# Altium schematic symbol library jlcpcb_2025_04_capacitors_extended_0805.schlib: 3281 symbols (part 13 of 18) (continued)
## FN21N391J500PXG
designator C?  Capacitance: 390pF  (hidden comment: *)
Capacitor, Ceramic (MLCC), 390pF, 50V, C0G, SMD 0805; Manufacturer: PSA(Prosperity Dielectrics); Manufacturer Part Number: FN21N391J500PXG; Package Size: 0805; JLCPCB Basic Part: No; JLCPCB Part Number: C2929169; Supplier 1: LCSC; Category: Capacitors - MLCC; Supplier Part Number 1: C2929169; Voltage Rating: 50V; Temperature Coefficient: C0G; RoHS: Yes; ComponentLink1Description: Datasheet; ComponentLink1URL: https://wmsc.lcsc.com/wmsc/upload/file/pdf/v2/lcsc/2201121400_PSA-Prosperity-Dielectrics-FN21N391J500PXG_C2929169.pdf; ComponentLink2Description: JLCPCB Part URL; ComponentLink2URL: https://jlcpcb.com/partdetail/C2929169; ComponentLink3Description: LCSC Part URL; ComponentLink3URL: https://lcsc.com/product-detail/Multilayer-Ceramic-Capacitors-MLCC---SMD-SMT_PSAProsperity-Dielectrics-PSAProsperity-Dielectrics-FN21N391J500PXG_C2929169.html
footprint CAP-0805 (0805 (2012M) Capacitor)
pins: 1, 2

## FN21N392J500ECG
designator C?  Capacitance: 3.9nF  (hidden comment: *)
Capacitor, Ceramic (MLCC), 3.9nF, ±5%, 50V, C0G, ±5%, SMD 0805; Manufacturer: PSA(Prosperity Dielectrics); Manufacturer Part Number: FN21N392J500ECG; Package Size: 0805; JLCPCB Basic Part: No; JLCPCB Part Number: C2915675; Supplier 1: LCSC; Category: Capacitors - MLCC; Supplier Part Number 1: C2915675; Tolerance: ±5%; Voltage Rating: 50V; Temperature Coefficient: C0G; RoHS: Yes; ComponentLink1Description: Datasheet; ComponentLink1URL: https://wmsc.lcsc.com/wmsc/upload/file/pdf/v2/lcsc/2111172030_PSA-Prosperity-Dielectrics-FN21N392J500ECG_C2915675.pdf; ComponentLink2Description: JLCPCB Part URL; ComponentLink2URL: https://jlcpcb.com/partdetail/C2915675; ComponentLink3Description: LCSC Part URL; ComponentLink3URL: https://lcsc.com/product-detail/Multilayer-Ceramic-Capacitors-MLCC---SMD-SMT_PSAProsperity-Dielectrics-PSAProsperity-Dielectrics-FN21N392J500ECG_C2915675.html
footprint CAP-0805 (0805 (2012M) Capacitor)
pins: 1, 2

## FN21N470J500PAG
designator C?  Capacitance: 47pF  (hidden comment: *)
Capacitor, Ceramic (MLCC), 47pF, ±5%, 50V, C0G, ±5%, SMD 0805; Manufacturer: PSA(Prosperity Dielectrics); Manufacturer Part Number: FN21N470J500PAG; Package Size: 0805; JLCPCB Basic Part: No; JLCPCB Part Number: C525291; Supplier 1: LCSC; Category: Capacitors - MLCC; Supplier Part Number 1: C525291; Tolerance: ±5%; Voltage Rating: 50V; Temperature Coefficient: C0G; RoHS: Yes; ComponentLink1Description: Datasheet; ComponentLink1URL: https://wmsc.lcsc.com/wmsc/upload/file/pdf/v2/lcsc/2304140030_PSA-Prosperity-Dielectrics-FN21N470J500PAG_C525291.pdf; ComponentLink2Description: JLCPCB Part URL; ComponentLink2URL: https://jlcpcb.com/partdetail/C525291; ComponentLink3Description: LCSC Part URL; ComponentLink3URL: https://lcsc.com/product-detail/Multilayer-Ceramic-Capacitors-MLCC---SMD-SMT_PSAProsperity-Dielectrics-PSAProsperity-Dielectrics-FN21N470J500PAG_C525291.html
footprint CAP-0805 (0805 (2012M) Capacitor)
pins: 1, 2

## FN21N472J500ECG
designator C?  Capacitance: 4.7nF  (hidden comment: *)
Capacitor, Ceramic (MLCC), 4.7nF, ±5%, 50V, NP0, ±5%, SMD 0805; Manufacturer: PSA(Prosperity Dielectrics); Manufacturer Part Number: FN21N472J500ECG; Package Size: 0805; JLCPCB Basic Part: No; JLCPCB Part Number: C784096; Supplier 1: LCSC; Category: Capacitors - MLCC; Supplier Part Number 1: C784096; Tolerance: ±5%; Voltage Rating: 50V; Temperature Coefficient: NP0; RoHS: Yes; ComponentLink1Description: Datasheet; ComponentLink1URL: https://wmsc.lcsc.com/wmsc/upload/file/pdf/v2/lcsc/2304140030_PSA-Prosperity-Dielectrics-FN21N472J500ECG_C784096.pdf; ComponentLink2Description: JLCPCB Part URL; ComponentLink2URL: https://jlcpcb.com/partdetail/C784096; ComponentLink3Description: LCSC Part URL; ComponentLink3URL: https://lcsc.com/product-detail/Multilayer-Ceramic-Capacitors-MLCC---SMD-SMT_PSAProsperity-Dielectrics-PSAProsperity-Dielectrics-FN21N472J500ECG_C784096.html
footprint CAP-0805 (0805 (2012M) Capacitor)
pins: 1, 2

## FN21N560J500PAG
designator C?  Capacitance: 56pF  (hidden comment: *)
Capacitor, Ceramic (MLCC), 56pF, ±5%, 50V, C0G, ±5%, SMD 0805; Manufacturer: PSA(Prosperity Dielectrics); Manufacturer Part Number: FN21N560J500PAG; Package Size: 0805; JLCPCB Basic Part: No; JLCPCB Part Number: C525293; Supplier 1: LCSC; Category: Capacitors - MLCC; Supplier Part Number 1: C525293; Tolerance: ±5%; Voltage Rating: 50V; Temperature Coefficient: C0G; RoHS: Yes; ComponentLink1Description: Datasheet; ComponentLink1URL: https://wmsc.lcsc.com/wmsc/upload/file/pdf/v2/lcsc/2304140030_PSA-Prosperity-Dielectrics-FN21N560J500PAG_C525293.pdf; ComponentLink2Description: JLCPCB Part URL; ComponentLink2URL: https://jlcpcb.com/partdetail/C525293; ComponentLink3Description: LCSC Part URL; ComponentLink3URL: https://lcsc.com/product-detail/Multilayer-Ceramic-Capacitors-MLCC---SMD-SMT_PSAProsperity-Dielectrics-PSAProsperity-Dielectrics-FN21N560J500PAG_C525293.html
footprint CAP-0805 (0805 (2012M) Capacitor)
pins: 1, 2

## FN21N561J500PXG
designator C?  Capacitance: 560pF  (hidden comment: *)
Capacitor, Ceramic (MLCC), 560pF, ±5%, 50V, C0G, ±5%, SMD 0805; Manufacturer: PSA(Prosperity Dielectrics); Manufacturer Part Number: FN21N561J500PXG; Package Size: 0805; JLCPCB Basic Part: No; JLCPCB Part Number: C525294; Supplier 1: LCSC; Category: Capacitors - MLCC; Supplier Part Number 1: C525294; Tolerance: ±5%; Voltage Rating: 50V; Temperature Coefficient: C0G; RoHS: Yes; ComponentLink1Description: Datasheet; ComponentLink1URL: https://wmsc.lcsc.com/wmsc/upload/file/pdf/v2/lcsc/2304140030_PSA-Prosperity-Dielectrics-FN21N561J500PXG_C525294.pdf; ComponentLink2Description: JLCPCB Part URL; ComponentLink2URL: https://jlcpcb.com/partdetail/C525294; ComponentLink3Description: LCSC Part URL; ComponentLink3URL: https://lcsc.com/product-detail/Multilayer-Ceramic-Capacitors-MLCC---SMD-SMT_PSAProsperity-Dielectrics-PSAProsperity-Dielectrics-FN21N561J500PXG_C525294.html
footprint CAP-0805 (0805 (2012M) Capacitor)
pins: 1, 2

## FN21N680J500PAG
designator C?  Capacitance: 68pF  (hidden comment: *)
Capacitor, Ceramic (MLCC), 68pF, ±5%, 50V, C0G, ±5%, SMD 0805; Manufacturer: PSA(Prosperity Dielectrics); Manufacturer Part Number: FN21N680J500PAG; Package Size: 0805; JLCPCB Basic Part: No; JLCPCB Part Number: C525295; Supplier 1: LCSC; Category: Capacitors - MLCC; Supplier Part Number 1: C525295; Tolerance: ±5%; Voltage Rating: 50V; Temperature Coefficient: C0G; RoHS: Yes; ComponentLink1Description: Datasheet; ComponentLink1URL: https://wmsc.lcsc.com/wmsc/upload/file/pdf/v2/lcsc/2304140030_PSA-Prosperity-Dielectrics-FN21N680J500PAG_C525295.pdf; ComponentLink2Description: JLCPCB Part URL; ComponentLink2URL: https://jlcpcb.com/partdetail/C525295; ComponentLink3Description: LCSC Part URL; ComponentLink3URL: https://lcsc.com/product-detail/Multilayer-Ceramic-Capacitors-MLCC---SMD-SMT_PSAProsperity-Dielectrics-PSAProsperity-Dielectrics-FN21N680J500PAG_C525295.html
footprint CAP-0805 (0805 (2012M) Capacitor)
pins: 1, 2

## FN21N681J500PXG
designator C?  Capacitance: 680pF  (hidden comment: *)
Capacitor, Ceramic (MLCC), 680pF, ±5%, 50V, C0G, ±5%, SMD 0805; Manufacturer: PSA(Prosperity Dielectrics); Manufacturer Part Number: FN21N681J500PXG; Package Size: 0805; JLCPCB Basic Part: No; JLCPCB Part Number: C525296; Supplier 1: LCSC; Category: Capacitors - MLCC; Supplier Part Number 1: C525296; Tolerance: ±5%; Voltage Rating: 50V; Temperature Coefficient: C0G; RoHS: Yes; ComponentLink1Description: Datasheet; ComponentLink1URL: https://wmsc.lcsc.com/wmsc/upload/file/pdf/v2/lcsc/2304140030_PSA-Prosperity-Dielectrics-FN21N681J500PXG_C525296.pdf; ComponentLink2Description: JLCPCB Part URL; ComponentLink2URL: https://jlcpcb.com/partdetail/C525296; ComponentLink3Description: LCSC Part URL; ComponentLink3URL: https://lcsc.com/product-detail/Multilayer-Ceramic-Capacitors-MLCC---SMD-SMT_PSAProsperity-Dielectrics-PSAProsperity-Dielectrics-FN21N681J500PXG_C525296.html
footprint CAP-0805 (0805 (2012M) Capacitor)
pins: 1, 2

## FN21N820J500PAG
designator C?  Capacitance: 82pF  (hidden comment: *)
Capacitor, Ceramic (MLCC), 82pF, ±5%, 50V, C0G, ±5%, SMD 0805; Manufacturer: PSA(Prosperity Dielectrics); Manufacturer Part Number: FN21N820J500PAG; Package Size: 0805; JLCPCB Basic Part: No; JLCPCB Part Number: C565577; Supplier 1: LCSC; Category: Capacitors - MLCC; Supplier Part Number 1: C565577; Tolerance: ±5%; Voltage Rating: 50V; Temperature Coefficient: C0G; RoHS: Yes; ComponentLink1Description: Datasheet; ComponentLink1URL: https://wmsc.lcsc.com/wmsc/upload/file/pdf/v2/lcsc/2304140030_PSA-Prosperity-Dielectrics-FN21N820J500PAG_C565577.pdf; ComponentLink2Description: JLCPCB Part URL; ComponentLink2URL: https://jlcpcb.com/partdetail/C565577; ComponentLink3Description: LCSC Part URL; ComponentLink3URL: https://lcsc.com/product-detail/Multilayer-Ceramic-Capacitors-MLCC---SMD-SMT_PSAProsperity-Dielectrics-PSAProsperity-Dielectrics-FN21N820J500PAG_C565577.html
footprint CAP-0805 (0805 (2012M) Capacitor)
pins: 1, 2

## FN21N821J500PXG
designator C?  Capacitance: 820pF  (hidden comment: *)
Capacitor, Ceramic (MLCC), 820pF, ±5%, 50V, C0G, ±5%, SMD 0805; Manufacturer: PSA(Prosperity Dielectrics); Manufacturer Part Number: FN21N821J500PXG; Package Size: 0805; JLCPCB Basic Part: No; JLCPCB Part Number: C2929170; Supplier 1: LCSC; Category: Capacitors - MLCC; Supplier Part Number 1: C2929170; Tolerance: ±5%; Voltage Rating: 50V; Temperature Coefficient: C0G; RoHS: Yes; ComponentLink1Description: Datasheet; ComponentLink1URL: https://wmsc.lcsc.com/wmsc/upload/file/pdf/v2/lcsc/2201121400_PSA-Prosperity-Dielectrics-FN21N821J500PXG_C2929170.pdf; ComponentLink2Description: JLCPCB Part URL; ComponentLink2URL: https://jlcpcb.com/partdetail/C2929170; ComponentLink3Description: LCSC Part URL; ComponentLink3URL: https://lcsc.com/product-detail/Multilayer-Ceramic-Capacitors-MLCC---SMD-SMT_PSAProsperity-Dielectrics-PSAProsperity-Dielectrics-FN21N821J500PXG_C2929170.html
footprint CAP-0805 (0805 (2012M) Capacitor)
pins: 1, 2

## FN21X101K500PXG
designator C?  Capacitance: 100pF  (hidden comment: *)
Capacitor, Ceramic (MLCC), 100pF, ±10%, 50V, X7R, ±10%, SMD 0805; Manufacturer: PSA(Prosperity Dielectrics); Manufacturer Part Number: FN21X101K500PXG; Package Size: 0805; JLCPCB Basic Part: No; JLCPCB Part Number: C525297; Supplier 1: LCSC; Category: Capacitors - MLCC; Supplier Part Number 1: C525297; Tolerance: ±10%; Voltage Rating: 50V; Temperature Coefficient: X7R; RoHS: Yes; ComponentLink1Description: Datasheet; ComponentLink1URL: https://wmsc.lcsc.com/wmsc/upload/file/pdf/v2/lcsc/2304140030_PSA-Prosperity-Dielectrics-FN21X101K500PXG_C525297.pdf; ComponentLink2Description: JLCPCB Part URL; ComponentLink2URL: https://jlcpcb.com/partdetail/C525297; ComponentLink3Description: LCSC Part URL; ComponentLink3URL: https://lcsc.com/product-detail/Multilayer-Ceramic-Capacitors-MLCC---SMD-SMT_PSAProsperity-Dielectrics-PSAProsperity-Dielectrics-FN21X101K500PXG_C525297.html
footprint CAP-0805 (0805 (2012M) Capacitor)
pins: 1, 2

## FN21X102K500PXG
designator C?  Capacitance: 1nF  (hidden comment: *)
Capacitor, Ceramic (MLCC), 1nF, ±10%, 50V, X7R, ±10%, SMD 0805; Manufacturer: PSA(Prosperity Dielectrics); Manufacturer Part Number: FN21X102K500PXG; Package Size: 0805; JLCPCB Basic Part: No; JLCPCB Part Number: C395966; Supplier 1: LCSC; Category: Capacitors - MLCC; Supplier Part Number 1: C395966; Tolerance: ±10%; Voltage Rating: 50V; Temperature Coefficient: X7R; RoHS: Yes; ComponentLink1Description: Datasheet; ComponentLink1URL: https://wmsc.lcsc.com/wmsc/upload/file/pdf/v2/lcsc/2304140030_PSA-Prosperity-Dielectrics-FN21X102K500PXG_C395966.pdf; ComponentLink2Description: JLCPCB Part URL; ComponentLink2URL: https://jlcpcb.com/partdetail/C395966; ComponentLink3Description: LCSC Part URL; ComponentLink3URL: https://lcsc.com/product-detail/Multilayer-Ceramic-Capacitors-MLCC---SMD-SMT_PSAProsperity-Dielectrics-PSAProsperity-Dielectrics-FN21X102K500PXG_C395966.html
footprint CAP-0805 (0805 (2012M) Capacitor)
pins: 1, 2

## FN21X103K500PXG
designator C?  Capacitance: 10nF  (hidden comment: *)
Capacitor, Ceramic (MLCC), 10nF, ±10%, 50V, X7R, ±10%, SMD 0805; Manufacturer: PSA(Prosperity Dielectrics); Manufacturer Part Number: FN21X103K500PXG; Package Size: 0805; JLCPCB Basic Part: No; JLCPCB Part Number: C525298; Supplier 1: LCSC; Category: Capacitors - MLCC; Supplier Part Number 1: C525298; Tolerance: ±10%; Voltage Rating: 50V; Temperature Coefficient: X7R; RoHS: Yes; ComponentLink1Description: Datasheet; ComponentLink1URL: https://wmsc.lcsc.com/wmsc/upload/file/pdf/v2/lcsc/2304140030_PSA-Prosperity-Dielectrics-FN21X103K500PXG_C525298.pdf; ComponentLink2Description: JLCPCB Part URL; ComponentLink2URL: https://jlcpcb.com/partdetail/C525298; ComponentLink3Description: LCSC Part URL; ComponentLink3URL: https://lcsc.com/product-detail/Multilayer-Ceramic-Capacitors-MLCC---SMD-SMT_PSAProsperity-Dielectrics-PSAProsperity-Dielectrics-FN21X103K500PXG_C525298.html
footprint CAP-0805 (0805 (2012M) Capacitor)
pins: 1, 2

## FN21X104J500PXG
designator C?  Capacitance: 100nF  (hidden comment: *)
Capacitor, Ceramic (MLCC), 100nF, ±5%, 50V, X7R, ±5%, SMD 0805; Manufacturer: PSA(Prosperity Dielectrics); Manufacturer Part Number: FN21X104J500PXG; Package Size: 0805; JLCPCB Basic Part: No; JLCPCB Part Number: C2915678; Supplier 1: LCSC; Category: Capacitors - MLCC; Supplier Part Number 1: C2915678; Tolerance: ±5%; Voltage Rating: 50V; Temperature Coefficient: X7R; RoHS: Yes; ComponentLink1Description: Datasheet; ComponentLink1URL: https://wmsc.lcsc.com/wmsc/upload/file/pdf/v2/lcsc/2111172030_PSA-Prosperity-Dielectrics-FN21X104J500PXG_C2915678.pdf; ComponentLink2Description: JLCPCB Part URL; ComponentLink2URL: https://jlcpcb.com/partdetail/C2915678; ComponentLink3Description: LCSC Part URL; ComponentLink3URL: https://lcsc.com/product-detail/Multilayer-Ceramic-Capacitors-MLCC---SMD-SMT_PSAProsperity-Dielectrics-PSAProsperity-Dielectrics-FN21X104J500PXG_C2915678.html
footprint CAP-0805 (0805 (2012M) Capacitor)
pins: 1, 2

## FN21X104K500ECG
designator C?  Capacitance: 100nF  (hidden comment: *)
Capacitor, Ceramic (MLCC), 100nF, ±10%, 50V, X7R, ±10%, SMD 0805; Manufacturer: PSA(Prosperity Dielectrics); Manufacturer Part Number: FN21X104K500ECG; Package Size: 0805; JLCPCB Basic Part: No; JLCPCB Part Number: C2847428; Supplier 1: LCSC; Category: Capacitors - MLCC; Supplier Part Number 1: C2847428; Tolerance: ±10%; Voltage Rating: 50V; Temperature Coefficient: X7R; RoHS: Yes; ComponentLink1Description: Datasheet; ComponentLink1URL: https://wmsc.lcsc.com/wmsc/upload/file/pdf/v2/lcsc/2108142130_PSA-Prosperity-Dielectrics-FN21X104K500ECG_C2847428.pdf; ComponentLink2Description: JLCPCB Part URL; ComponentLink2URL: https://jlcpcb.com/partdetail/C2847428; ComponentLink3Description: LCSC Part URL; ComponentLink3URL: https://lcsc.com/product-detail/Multilayer-Ceramic-Capacitors-MLCC---SMD-SMT_PSAProsperity-Dielectrics-PSAProsperity-Dielectrics-FN21X104K500ECG_C2847428.html
footprint CAP-0805 (0805 (2012M) Capacitor)
pins: 1, 2

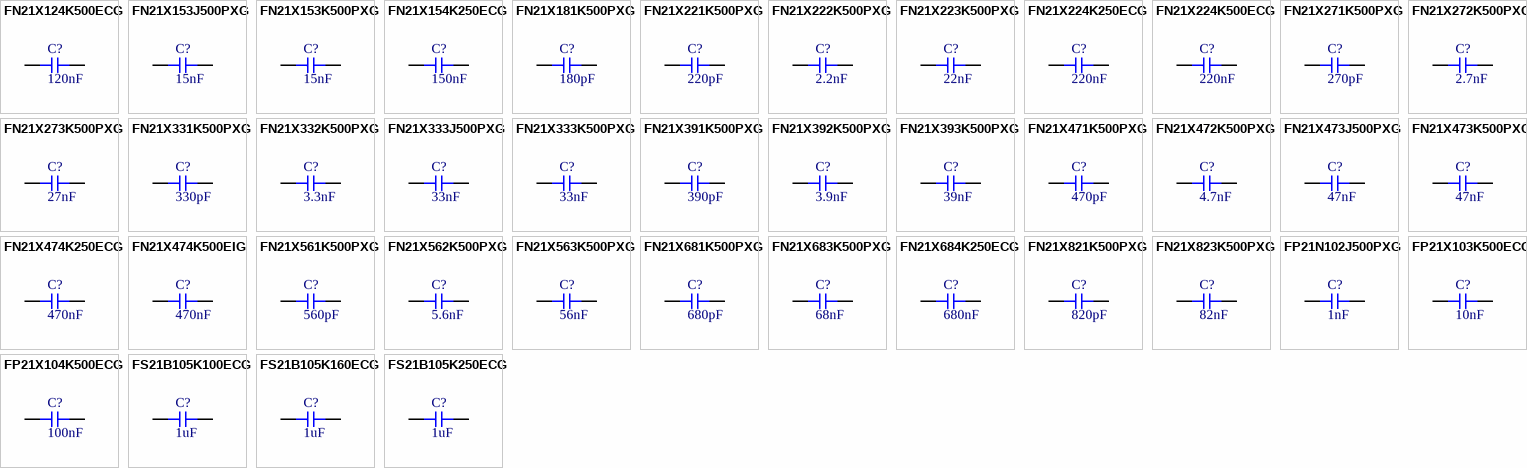
[diagram p59: symbols FN21X124K500ECG to FS21B105K250ECG]

## FN21X124K500ECG
designator C?  Capacitance: 120nF  (hidden comment: *)
Capacitor, Ceramic (MLCC), 120nF, ±10%, 50V, X7R, ±10%, SMD 0805; Manufacturer: PSA(Prosperity Dielectrics); Manufacturer Part Number: FN21X124K500ECG; Package Size: 0805; JLCPCB Basic Part: No; JLCPCB Part Number: C525299; Supplier 1: LCSC; Category: Capacitors - MLCC; Supplier Part Number 1: C525299; Tolerance: ±10%; Voltage Rating: 50V; Temperature Coefficient: X7R; RoHS: Yes; ComponentLink1Description: Datasheet; ComponentLink1URL: https://wmsc.lcsc.com/wmsc/upload/file/pdf/v2/lcsc/2304140030_PSA-Prosperity-Dielectrics-FN21X124K500ECG_C525299.pdf; ComponentLink2Description: JLCPCB Part URL; ComponentLink2URL: https://jlcpcb.com/partdetail/C525299; ComponentLink3Description: LCSC Part URL; ComponentLink3URL: https://lcsc.com/product-detail/Multilayer-Ceramic-Capacitors-MLCC---SMD-SMT_PSAProsperity-Dielectrics-PSAProsperity-Dielectrics-FN21X124K500ECG_C525299.html
footprint CAP-0805 (0805 (2012M) Capacitor)
pins: 1, 2

## FN21X153J500PXG
designator C?  Capacitance: 15nF  (hidden comment: *)
Capacitor, Ceramic (MLCC), 15nF, 50V, X7R, SMD 0805; Manufacturer: PSA(Prosperity Dielectrics); Manufacturer Part Number: FN21X153J500PXG; Package Size: 0805; JLCPCB Basic Part: No; JLCPCB Part Number: C2915679; Supplier 1: LCSC; Category: Capacitors - MLCC; Supplier Part Number 1: C2915679; Voltage Rating: 50V; Temperature Coefficient: X7R; RoHS: Yes; ComponentLink1Description: Datasheet; ComponentLink1URL: https://wmsc.lcsc.com/wmsc/upload/file/pdf/v2/lcsc/2111172030_PSA-Prosperity-Dielectrics-FN21X153J500PXG_C2915679.pdf; ComponentLink2Description: JLCPCB Part URL; ComponentLink2URL: https://jlcpcb.com/partdetail/C2915679; ComponentLink3Description: LCSC Part URL; ComponentLink3URL: https://lcsc.com/product-detail/Multilayer-Ceramic-Capacitors-MLCC---SMD-SMT_PSAProsperity-Dielectrics-PSAProsperity-Dielectrics-FN21X153J500PXG_C2915679.html
footprint CAP-0805 (0805 (2012M) Capacitor)
pins: 1, 2

## FN21X153K500PXG
designator C?  Capacitance: 15nF  (hidden comment: *)
Capacitor, Ceramic (MLCC), 15nF, ±10%, 50V, X7R, ±10%, SMD 0805; Manufacturer: PSA(Prosperity Dielectrics); Manufacturer Part Number: FN21X153K500PXG; Package Size: 0805; JLCPCB Basic Part: No; JLCPCB Part Number: C2847444; Supplier 1: LCSC; Category: Capacitors - MLCC; Supplier Part Number 1: C2847444; Tolerance: ±10%; Voltage Rating: 50V; Temperature Coefficient: X7R; RoHS: Yes; ComponentLink1Description: Datasheet; ComponentLink1URL: https://wmsc.lcsc.com/wmsc/upload/file/pdf/v2/lcsc/2108142230_PSA-Prosperity-Dielectrics-FN21X153K500PXG_C2847444.pdf; ComponentLink2Description: JLCPCB Part URL; ComponentLink2URL: https://jlcpcb.com/partdetail/C2847444; ComponentLink3Description: LCSC Part URL; ComponentLink3URL: https://lcsc.com/product-detail/Multilayer-Ceramic-Capacitors-MLCC---SMD-SMT_PSAProsperity-Dielectrics-PSAProsperity-Dielectrics-FN21X153K500PXG_C2847444.html
footprint CAP-0805 (0805 (2012M) Capacitor)
pins: 1, 2

## FN21X154K250ECG
designator C?  Capacitance: 150nF  (hidden comment: *)
Capacitor, Ceramic (MLCC), 150nF, 25V, X7R, SMD 0805; Manufacturer: PSA(Prosperity Dielectrics); Manufacturer Part Number: FN21X154K250ECG; Package Size: 0805; JLCPCB Basic Part: No; JLCPCB Part Number: C2915680; Supplier 1: LCSC; Category: Capacitors - MLCC; Supplier Part Number 1: C2915680; Voltage Rating: 25V; Temperature Coefficient: X7R; RoHS: Yes; ComponentLink1Description: Datasheet; ComponentLink1URL: https://wmsc.lcsc.com/wmsc/upload/file/pdf/v2/lcsc/2201121230_PSA-Prosperity-Dielectrics-FN21X154K250ECG_C2915680.pdf; ComponentLink2Description: JLCPCB Part URL; ComponentLink2URL: https://jlcpcb.com/partdetail/C2915680; ComponentLink3Description: LCSC Part URL; ComponentLink3URL: https://lcsc.com/product-detail/Multilayer-Ceramic-Capacitors-MLCC---SMD-SMT_PSAProsperity-Dielectrics-PSAProsperity-Dielectrics-FN21X154K250ECG_C2915680.html
footprint CAP-0805 (0805 (2012M) Capacitor)
pins: 1, 2

## FN21X181K500PXG
designator C?  Capacitance: 180pF  (hidden comment: *)
Capacitor, Ceramic (MLCC), 180pF, ±10%, 50V, X7R, ±10%, SMD 0805; Manufacturer: PSA(Prosperity Dielectrics); Manufacturer Part Number: FN21X181K500PXG; Package Size: 0805; JLCPCB Basic Part: No; JLCPCB Part Number: C2847443; Supplier 1: LCSC; Category: Capacitors - MLCC; Supplier Part Number 1: C2847443; Tolerance: ±10%; Voltage Rating: 50V; Temperature Coefficient: X7R; RoHS: Yes; ComponentLink1Description: Datasheet; ComponentLink1URL: https://wmsc.lcsc.com/wmsc/upload/file/pdf/v2/lcsc/2108142230_PSA-Prosperity-Dielectrics-FN21X181K500PXG_C2847443.pdf; ComponentLink2Description: JLCPCB Part URL; ComponentLink2URL: https://jlcpcb.com/partdetail/C2847443; ComponentLink3Description: LCSC Part URL; ComponentLink3URL: https://lcsc.com/product-detail/Multilayer-Ceramic-Capacitors-MLCC---SMD-SMT_PSAProsperity-Dielectrics-PSAProsperity-Dielectrics-FN21X181K500PXG_C2847443.html
footprint CAP-0805 (0805 (2012M) Capacitor)
pins: 1, 2

## FN21X221K500PXG
designator C?  Capacitance: 220pF  (hidden comment: *)
Capacitor, Ceramic (MLCC), 220pF, ±10%, 50V, X7R, ±10%, SMD 0805; Manufacturer: PSA(Prosperity Dielectrics); Manufacturer Part Number: FN21X221K500PXG; Package Size: 0805; JLCPCB Basic Part: No; JLCPCB Part Number: C525300; Supplier 1: LCSC; Category: Capacitors - MLCC; Supplier Part Number 1: C525300; Tolerance: ±10%; Voltage Rating: 50V; Temperature Coefficient: X7R; RoHS: Yes; ComponentLink1Description: Datasheet; ComponentLink1URL: https://wmsc.lcsc.com/wmsc/upload/file/pdf/v2/lcsc/2304140030_PSA-Prosperity-Dielectrics-FN21X221K500PXG_C525300.pdf; ComponentLink2Description: JLCPCB Part URL; ComponentLink2URL: https://jlcpcb.com/partdetail/C525300; ComponentLink3Description: LCSC Part URL; ComponentLink3URL: https://lcsc.com/product-detail/Multilayer-Ceramic-Capacitors-MLCC---SMD-SMT_PSAProsperity-Dielectrics-PSAProsperity-Dielectrics-FN21X221K500PXG_C525300.html
footprint CAP-0805 (0805 (2012M) Capacitor)
pins: 1, 2

## FN21X222K500PXG
designator C?  Capacitance: 2.2nF  (hidden comment: *)
Capacitor, Ceramic (MLCC), 2.2nF, ±10%, 50V, X7R, ±10%, SMD 0805; Manufacturer: PSA(Prosperity Dielectrics); Manufacturer Part Number: FN21X222K500PXG; Package Size: 0805; JLCPCB Basic Part: No; JLCPCB Part Number: C395967; Supplier 1: LCSC; Category: Capacitors - MLCC; Supplier Part Number 1: C395967; Tolerance: ±10%; Voltage Rating: 50V; Temperature Coefficient: X7R; RoHS: Yes; ComponentLink1Description: Datasheet; ComponentLink1URL: https://wmsc.lcsc.com/wmsc/upload/file/pdf/v2/lcsc/2304140030_PSA-Prosperity-Dielectrics-FN21X222K500PXG_C395967.pdf; ComponentLink2Description: JLCPCB Part URL; ComponentLink2URL: https://jlcpcb.com/partdetail/C395967; ComponentLink3Description: LCSC Part URL; ComponentLink3URL: https://lcsc.com/product-detail/Multilayer-Ceramic-Capacitors-MLCC---SMD-SMT_PSAProsperity-Dielectrics-PSAProsperity-Dielectrics-FN21X222K500PXG_C395967.html
footprint CAP-0805 (0805 (2012M) Capacitor)
pins: 1, 2

## FN21X223K500PXG
designator C?  Capacitance: 22nF  (hidden comment: *)
Capacitor, Ceramic (MLCC), 22nF, ±10%, 50V, X7R, ±10%, SMD 0805; Manufacturer: PSA(Prosperity Dielectrics); Manufacturer Part Number: FN21X223K500PXG; Package Size: 0805; JLCPCB Basic Part: No; JLCPCB Part Number: C525301; Supplier 1: LCSC; Category: Capacitors - MLCC; Supplier Part Number 1: C525301; Tolerance: ±10%; Voltage Rating: 50V; Temperature Coefficient: X7R; RoHS: Yes; ComponentLink1Description: Datasheet; ComponentLink1URL: https://wmsc.lcsc.com/wmsc/upload/file/pdf/v2/lcsc/2304140030_PSA-Prosperity-Dielectrics-FN21X223K500PXG_C525301.pdf; ComponentLink2Description: JLCPCB Part URL; ComponentLink2URL: https://jlcpcb.com/partdetail/C525301; ComponentLink3Description: LCSC Part URL; ComponentLink3URL: https://lcsc.com/product-detail/Multilayer-Ceramic-Capacitors-MLCC---SMD-SMT_PSAProsperity-Dielectrics-PSAProsperity-Dielectrics-FN21X223K500PXG_C525301.html
footprint CAP-0805 (0805 (2012M) Capacitor)
pins: 1, 2

## FN21X224K250ECG
designator C?  Capacitance: 220nF  (hidden comment: *)
Capacitor, Ceramic (MLCC), 220nF, ±10%, 25V, X7R, ±10%, SMD 0805; Manufacturer: PSA(Prosperity Dielectrics); Manufacturer Part Number: FN21X224K250ECG; Package Size: 0805; JLCPCB Basic Part: No; JLCPCB Part Number: C525302; Supplier 1: LCSC; Category: Capacitors - MLCC; Supplier Part Number 1: C525302; Tolerance: ±10%; Voltage Rating: 25V; Temperature Coefficient: X7R; RoHS: Yes; ComponentLink1Description: Datasheet; ComponentLink1URL: https://wmsc.lcsc.com/wmsc/upload/file/pdf/v2/lcsc/2304140030_PSA-Prosperity-Dielectrics-FN21X224K250ECG_C525302.pdf; ComponentLink2Description: JLCPCB Part URL; ComponentLink2URL: https://jlcpcb.com/partdetail/C525302; ComponentLink3Description: LCSC Part URL; ComponentLink3URL: https://lcsc.com/product-detail/Multilayer-Ceramic-Capacitors-MLCC---SMD-SMT_PSAProsperity-Dielectrics-PSAProsperity-Dielectrics-FN21X224K250ECG_C525302.html
footprint CAP-0805 (0805 (2012M) Capacitor)
pins: 1, 2

## FN21X224K500ECG
designator C?  Capacitance: 220nF  (hidden comment: *)
Capacitor, Ceramic (MLCC), 220nF, ±10%, 50V, X7R, ±10%, SMD 0805; Manufacturer: PSA(Prosperity Dielectrics); Manufacturer Part Number: FN21X224K500ECG; Package Size: 0805; JLCPCB Basic Part: No; JLCPCB Part Number: C525303; Supplier 1: LCSC; Category: Capacitors - MLCC; Supplier Part Number 1: C525303; Tolerance: ±10%; Voltage Rating: 50V; Temperature Coefficient: X7R; RoHS: Yes; ComponentLink1Description: Datasheet; ComponentLink1URL: https://wmsc.lcsc.com/wmsc/upload/file/pdf/v2/lcsc/2304140030_PSA-Prosperity-Dielectrics-FN21X224K500ECG_C525303.pdf; ComponentLink2Description: JLCPCB Part URL; ComponentLink2URL: https://jlcpcb.com/partdetail/C525303; ComponentLink3Description: LCSC Part URL; ComponentLink3URL: https://lcsc.com/product-detail/Multilayer-Ceramic-Capacitors-MLCC---SMD-SMT_PSAProsperity-Dielectrics-PSAProsperity-Dielectrics-FN21X224K500ECG_C525303.html
footprint CAP-0805 (0805 (2012M) Capacitor)
pins: 1, 2

## FN21X271K500PXG
designator C?  Capacitance: 270pF  (hidden comment: *)
Capacitor, Ceramic (MLCC), 270pF, ±10%, 50V, X7R, ±10%, SMD 0805; Manufacturer: PSA(Prosperity Dielectrics); Manufacturer Part Number: FN21X271K500PXG; Package Size: 0805; JLCPCB Basic Part: No; JLCPCB Part Number: C565619; Supplier 1: LCSC; Category: Capacitors - MLCC; Supplier Part Number 1: C565619; Tolerance: ±10%; Voltage Rating: 50V; Temperature Coefficient: X7R; RoHS: Yes; ComponentLink1Description: Datasheet; ComponentLink1URL: https://wmsc.lcsc.com/wmsc/upload/file/pdf/v2/lcsc/2304140030_PSA-Prosperity-Dielectrics-FN21X271K500PXG_C565619.pdf; ComponentLink2Description: JLCPCB Part URL; ComponentLink2URL: https://jlcpcb.com/partdetail/C565619; ComponentLink3Description: LCSC Part URL; ComponentLink3URL: https://lcsc.com/product-detail/Multilayer-Ceramic-Capacitors-MLCC---SMD-SMT_PSAProsperity-Dielectrics-PSAProsperity-Dielectrics-FN21X271K500PXG_C565619.html
footprint CAP-0805 (0805 (2012M) Capacitor)
pins: 1, 2

## FN21X272K500PXG
designator C?  Capacitance: 2.7nF  (hidden comment: *)
Capacitor, Ceramic (MLCC), 2.7nF, ±10%, 50V, X7R, ±10%, SMD 0805; Manufacturer: PSA(Prosperity Dielectrics); Manufacturer Part Number: FN21X272K500PXG; Package Size: 0805; JLCPCB Basic Part: No; JLCPCB Part Number: C565620; Supplier 1: LCSC; Category: Capacitors - MLCC; Supplier Part Number 1: C565620; Tolerance: ±10%; Voltage Rating: 50V; Temperature Coefficient: X7R; RoHS: Yes; ComponentLink1Description: Datasheet; ComponentLink1URL: https://wmsc.lcsc.com/wmsc/upload/file/pdf/v2/lcsc/2304140030_PSA-Prosperity-Dielectrics-FN21X272K500PXG_C565620.pdf; ComponentLink2Description: JLCPCB Part URL; ComponentLink2URL: https://jlcpcb.com/partdetail/C565620; ComponentLink3Description: LCSC Part URL; ComponentLink3URL: https://lcsc.com/product-detail/Multilayer-Ceramic-Capacitors-MLCC---SMD-SMT_PSAProsperity-Dielectrics-PSAProsperity-Dielectrics-FN21X272K500PXG_C565620.html
footprint CAP-0805 (0805 (2012M) Capacitor)
pins: 1, 2

## FN21X273K500PXG
designator C?  Capacitance: 27nF  (hidden comment: *)
Capacitor, Ceramic (MLCC), 27nF, ±10%, 50V, X7R, ±10%, SMD 0805; Manufacturer: PSA(Prosperity Dielectrics); Manufacturer Part Number: FN21X273K500PXG; Package Size: 0805; JLCPCB Basic Part: No; JLCPCB Part Number: C565621; Supplier 1: LCSC; Category: Capacitors - MLCC; Supplier Part Number 1: C565621; Tolerance: ±10%; Voltage Rating: 50V; Temperature Coefficient: X7R; RoHS: Yes; ComponentLink1Description: Datasheet; ComponentLink1URL: https://wmsc.lcsc.com/wmsc/upload/file/pdf/v2/lcsc/2304140030_PSA-Prosperity-Dielectrics-FN21X273K500PXG_C565621.pdf; ComponentLink2Description: JLCPCB Part URL; ComponentLink2URL: https://jlcpcb.com/partdetail/C565621; ComponentLink3Description: LCSC Part URL; ComponentLink3URL: https://lcsc.com/product-detail/Multilayer-Ceramic-Capacitors-MLCC---SMD-SMT_PSAProsperity-Dielectrics-PSAProsperity-Dielectrics-FN21X273K500PXG_C565621.html
footprint CAP-0805 (0805 (2012M) Capacitor)
pins: 1, 2

## FN21X331K500PXG
designator C?  Capacitance: 330pF  (hidden comment: *)
Capacitor, Ceramic (MLCC), 330pF, ±10%, 50V, X7R, ±10%, SMD 0805; Manufacturer: PSA(Prosperity Dielectrics); Manufacturer Part Number: FN21X331K500PXG; Package Size: 0805; JLCPCB Basic Part: No; JLCPCB Part Number: C565605; Supplier 1: LCSC; Category: Capacitors - MLCC; Supplier Part Number 1: C565605; Tolerance: ±10%; Voltage Rating: 50V; Temperature Coefficient: X7R; RoHS: Yes; ComponentLink1Description: Datasheet; ComponentLink1URL: https://wmsc.lcsc.com/wmsc/upload/file/pdf/v2/lcsc/2304140030_PSA-Prosperity-Dielectrics-FN21X331K500PXG_C565605.pdf; ComponentLink2Description: JLCPCB Part URL; ComponentLink2URL: https://jlcpcb.com/partdetail/C565605; ComponentLink3Description: LCSC Part URL; ComponentLink3URL: https://lcsc.com/product-detail/Multilayer-Ceramic-Capacitors-MLCC---SMD-SMT_PSAProsperity-Dielectrics-PSAProsperity-Dielectrics-FN21X331K500PXG_C565605.html
footprint CAP-0805 (0805 (2012M) Capacitor)
pins: 1, 2

## FN21X332K500PXG
designator C?  Capacitance: 3.3nF  (hidden comment: *)
Capacitor, Ceramic (MLCC), 3.3nF, ±10%, 50V, X7R, ±10%, SMD 0805; Manufacturer: PSA(Prosperity Dielectrics); Manufacturer Part Number: FN21X332K500PXG; Package Size: 0805; JLCPCB Basic Part: No; JLCPCB Part Number: C525304; Supplier 1: LCSC; Category: Capacitors - MLCC; Supplier Part Number 1: C525304; Tolerance: ±10%; Voltage Rating: 50V; Temperature Coefficient: X7R; RoHS: Yes; ComponentLink1Description: Datasheet; ComponentLink1URL: https://wmsc.lcsc.com/wmsc/upload/file/pdf/v2/lcsc/2304140030_PSA-Prosperity-Dielectrics-FN21X332K500PXG_C525304.pdf; ComponentLink2Description: JLCPCB Part URL; ComponentLink2URL: https://jlcpcb.com/partdetail/C525304; ComponentLink3Description: LCSC Part URL; ComponentLink3URL: https://lcsc.com/product-detail/Multilayer-Ceramic-Capacitors-MLCC---SMD-SMT_PSAProsperity-Dielectrics-PSAProsperity-Dielectrics-FN21X332K500PXG_C525304.html
footprint CAP-0805 (0805 (2012M) Capacitor)
pins: 1, 2

## FN21X333J500PXG
designator C?  Capacitance: 33nF  (hidden comment: *)
Capacitor, Ceramic (MLCC), 33nF, ±5%, 50V, X7R, ±5%, SMD 0805; Manufacturer: PSA(Prosperity Dielectrics); Manufacturer Part Number: FN21X333J500PXG; Package Size: 0805; JLCPCB Basic Part: No; JLCPCB Part Number: C2874761; Supplier 1: LCSC; Category: Capacitors - MLCC; Supplier Part Number 1: C2874761; Tolerance: ±5%; Voltage Rating: 50V; Temperature Coefficient: X7R; RoHS: Yes; ComponentLink1Description: Datasheet; ComponentLink1URL: https://wmsc.lcsc.com/wmsc/upload/file/pdf/v2/lcsc/2108150330_PSA-Prosperity-Dielectrics-FN21X333J500PXG_C2874761.pdf; ComponentLink2Description: JLCPCB Part URL; ComponentLink2URL: https://jlcpcb.com/partdetail/C2874761; ComponentLink3Description: LCSC Part URL; ComponentLink3URL: https://lcsc.com/product-detail/Multilayer-Ceramic-Capacitors-MLCC---SMD-SMT_PSAProsperity-Dielectrics-PSAProsperity-Dielectrics-FN21X333J500PXG_C2874761.html
footprint CAP-0805 (0805 (2012M) Capacitor)
pins: 1, 2

## FN21X333K500PXG
designator C?  Capacitance: 33nF  (hidden comment: *)
Capacitor, Ceramic (MLCC), 33nF, ±10%, 50V, X7R, ±10%, SMD 0805; Manufacturer: PSA(Prosperity Dielectrics); Manufacturer Part Number: FN21X333K500PXG; Package Size: 0805; JLCPCB Basic Part: No; JLCPCB Part Number: C525305; Supplier 1: LCSC; Category: Capacitors - MLCC; Supplier Part Number 1: C525305; Tolerance: ±10%; Voltage Rating: 50V; Temperature Coefficient: X7R; RoHS: Yes; ComponentLink1Description: Datasheet; ComponentLink1URL: https://wmsc.lcsc.com/wmsc/upload/file/pdf/v2/lcsc/2304140030_PSA-Prosperity-Dielectrics-FN21X333K500PXG_C525305.pdf; ComponentLink2Description: JLCPCB Part URL; ComponentLink2URL: https://jlcpcb.com/partdetail/C525305; ComponentLink3Description: LCSC Part URL; ComponentLink3URL: https://lcsc.com/product-detail/Multilayer-Ceramic-Capacitors-MLCC---SMD-SMT_PSAProsperity-Dielectrics-PSAProsperity-Dielectrics-FN21X333K500PXG_C525305.html
footprint CAP-0805 (0805 (2012M) Capacitor)
pins: 1, 2

## FN21X391K500PXG
designator C?  Capacitance: 390pF  (hidden comment: *)
Capacitor, Ceramic (MLCC), 390pF, ±10%, 50V, X7R, ±10%, SMD 0805; Manufacturer: PSA(Prosperity Dielectrics); Manufacturer Part Number: FN21X391K500PXG; Package Size: 0805; JLCPCB Basic Part: No; JLCPCB Part Number: C565622; Supplier 1: LCSC; Category: Capacitors - MLCC; Supplier Part Number 1: C565622; Tolerance: ±10%; Voltage Rating: 50V; Temperature Coefficient: X7R; RoHS: Yes; ComponentLink1Description: Datasheet; ComponentLink1URL: https://wmsc.lcsc.com/wmsc/upload/file/pdf/v2/lcsc/2304140030_PSA-Prosperity-Dielectrics-FN21X391K500PXG_C565622.pdf; ComponentLink2Description: JLCPCB Part URL; ComponentLink2URL: https://jlcpcb.com/partdetail/C565622; ComponentLink3Description: LCSC Part URL; ComponentLink3URL: https://lcsc.com/product-detail/Multilayer-Ceramic-Capacitors-MLCC---SMD-SMT_PSAProsperity-Dielectrics-PSAProsperity-Dielectrics-FN21X391K500PXG_C565622.html
footprint CAP-0805 (0805 (2012M) Capacitor)
pins: 1, 2

## FN21X392K500PXG
designator C?  Capacitance: 3.9nF  (hidden comment: *)
Capacitor, Ceramic (MLCC), 3.9nF, ±10%, 50V, X7R, ±10%, SMD 0805; Manufacturer: PSA(Prosperity Dielectrics); Manufacturer Part Number: FN21X392K500PXG; Package Size: 0805; JLCPCB Basic Part: No; JLCPCB Part Number: C565623; Supplier 1: LCSC; Category: Capacitors - MLCC; Supplier Part Number 1: C565623; Tolerance: ±10%; Voltage Rating: 50V; Temperature Coefficient: X7R; RoHS: Yes; ComponentLink1Description: Datasheet; ComponentLink1URL: https://wmsc.lcsc.com/wmsc/upload/file/pdf/v2/lcsc/2304140030_PSA-Prosperity-Dielectrics-FN21X392K500PXG_C565623.pdf; ComponentLink2Description: JLCPCB Part URL; ComponentLink2URL: https://jlcpcb.com/partdetail/C565623; ComponentLink3Description: LCSC Part URL; ComponentLink3URL: https://lcsc.com/product-detail/Multilayer-Ceramic-Capacitors-MLCC---SMD-SMT_PSAProsperity-Dielectrics-PSAProsperity-Dielectrics-FN21X392K500PXG_C565623.html
footprint CAP-0805 (0805 (2012M) Capacitor)
pins: 1, 2

## FN21X393K500PXG
designator C?  Capacitance: 39nF  (hidden comment: *)
Capacitor, Ceramic (MLCC), 39nF, ±10%, 50V, X7R, ±10%, SMD 0805; Manufacturer: PSA(Prosperity Dielectrics); Manufacturer Part Number: FN21X393K500PXG; Package Size: 0805; JLCPCB Basic Part: No; JLCPCB Part Number: C565624; Supplier 1: LCSC; Category: Capacitors - MLCC; Supplier Part Number 1: C565624; Tolerance: ±10%; Voltage Rating: 50V; Temperature Coefficient: X7R; RoHS: Yes; ComponentLink1Description: Datasheet; ComponentLink1URL: https://wmsc.lcsc.com/wmsc/upload/file/pdf/v2/lcsc/2304140030_PSA-Prosperity-Dielectrics-FN21X393K500PXG_C565624.pdf; ComponentLink2Description: JLCPCB Part URL; ComponentLink2URL: https://jlcpcb.com/partdetail/C565624; ComponentLink3Description: LCSC Part URL; ComponentLink3URL: https://lcsc.com/product-detail/Multilayer-Ceramic-Capacitors-MLCC---SMD-SMT_PSAProsperity-Dielectrics-PSAProsperity-Dielectrics-FN21X393K500PXG_C565624.html
footprint CAP-0805 (0805 (2012M) Capacitor)
pins: 1, 2

## FN21X471K500PXG
designator C?  Capacitance: 470pF  (hidden comment: *)
Capacitor, Ceramic (MLCC), 470pF, ±10%, 50V, X7R, ±10%, SMD 0805; Manufacturer: PSA(Prosperity Dielectrics); Manufacturer Part Number: FN21X471K500PXG; Package Size: 0805; JLCPCB Basic Part: No; JLCPCB Part Number: C525308; Supplier 1: LCSC; Category: Capacitors - MLCC; Supplier Part Number 1: C525308; Tolerance: ±10%; Voltage Rating: 50V; Temperature Coefficient: X7R; RoHS: Yes; ComponentLink1Description: Datasheet; ComponentLink1URL: https://wmsc.lcsc.com/wmsc/upload/file/pdf/v2/lcsc/2304140030_PSA-Prosperity-Dielectrics-FN21X471K500PXG_C525308.pdf; ComponentLink2Description: JLCPCB Part URL; ComponentLink2URL: https://jlcpcb.com/partdetail/C525308; ComponentLink3Description: LCSC Part URL; ComponentLink3URL: https://lcsc.com/product-detail/Multilayer-Ceramic-Capacitors-MLCC---SMD-SMT_PSAProsperity-Dielectrics-PSAProsperity-Dielectrics-FN21X471K500PXG_C525308.html
footprint CAP-0805 (0805 (2012M) Capacitor)
pins: 1, 2

## FN21X472K500PXG
designator C?  Capacitance: 4.7nF  (hidden comment: *)
Capacitor, Ceramic (MLCC), 4.7nF, ±10%, 50V, X7R, ±10%, SMD 0805; Manufacturer: PSA(Prosperity Dielectrics); Manufacturer Part Number: FN21X472K500PXG; Package Size: 0805; JLCPCB Basic Part: No; JLCPCB Part Number: C565606; Supplier 1: LCSC; Category: Capacitors - MLCC; Supplier Part Number 1: C565606; Tolerance: ±10%; Voltage Rating: 50V; Temperature Coefficient: X7R; RoHS: Yes; ComponentLink1Description: Datasheet; ComponentLink1URL: https://wmsc.lcsc.com/wmsc/upload/file/pdf/v2/lcsc/2304140030_PSA-Prosperity-Dielectrics-FN21X472K500PXG_C565606.pdf; ComponentLink2Description: JLCPCB Part URL; ComponentLink2URL: https://jlcpcb.com/partdetail/C565606; ComponentLink3Description: LCSC Part URL; ComponentLink3URL: https://lcsc.com/product-detail/Multilayer-Ceramic-Capacitors-MLCC---SMD-SMT_PSAProsperity-Dielectrics-PSAProsperity-Dielectrics-FN21X472K500PXG_C565606.html
footprint CAP-0805 (0805 (2012M) Capacitor)
pins: 1, 2

## FN21X473J500PXG
designator C?  Capacitance: 47nF  (hidden comment: *)
Capacitor, Ceramic (MLCC), 47nF, 50V, X7R, SMD 0805; Manufacturer: PSA(Prosperity Dielectrics); Manufacturer Part Number: FN21X473J500PXG; Package Size: 0805; JLCPCB Basic Part: No; JLCPCB Part Number: C2915681; Supplier 1: LCSC; Category: Capacitors - MLCC; Supplier Part Number 1: C2915681; Voltage Rating: 50V; Temperature Coefficient: X7R; RoHS: Yes; ComponentLink1Description: Datasheet; ComponentLink1URL: https://wmsc.lcsc.com/wmsc/upload/file/pdf/v2/lcsc/2111172030_PSA-Prosperity-Dielectrics-FN21X473J500PXG_C2915681.pdf; ComponentLink2Description: JLCPCB Part URL; ComponentLink2URL: https://jlcpcb.com/partdetail/C2915681; ComponentLink3Description: LCSC Part URL; ComponentLink3URL: https://lcsc.com/product-detail/Multilayer-Ceramic-Capacitors-MLCC---SMD-SMT_PSAProsperity-Dielectrics-PSAProsperity-Dielectrics-FN21X473J500PXG_C2915681.html
footprint CAP-0805 (0805 (2012M) Capacitor)
pins: 1, 2

## FN21X473K500PXG
designator C?  Capacitance: 47nF  (hidden comment: *)
Capacitor, Ceramic (MLCC), 47nF, ±10%, 50V, X7R, ±10%, SMD 0805; Manufacturer: PSA(Prosperity Dielectrics); Manufacturer Part Number: FN21X473K500PXG; Package Size: 0805; JLCPCB Basic Part: No; JLCPCB Part Number: C525309; Supplier 1: LCSC; Category: Capacitors - MLCC; Supplier Part Number 1: C525309; Tolerance: ±10%; Voltage Rating: 50V; Temperature Coefficient: X7R; RoHS: Yes; ComponentLink1Description: Datasheet; ComponentLink1URL: https://wmsc.lcsc.com/wmsc/upload/file/pdf/v2/lcsc/2304140030_PSA-Prosperity-Dielectrics-FN21X473K500PXG_C525309.pdf; ComponentLink2Description: JLCPCB Part URL; ComponentLink2URL: https://jlcpcb.com/partdetail/C525309; ComponentLink3Description: LCSC Part URL; ComponentLink3URL: https://lcsc.com/product-detail/Multilayer-Ceramic-Capacitors-MLCC---SMD-SMT_PSAProsperity-Dielectrics-PSAProsperity-Dielectrics-FN21X473K500PXG_C525309.html
footprint CAP-0805 (0805 (2012M) Capacitor)
pins: 1, 2

## FN21X474K250ECG
designator C?  Capacitance: 470nF  (hidden comment: *)
Capacitor, Ceramic (MLCC), 470nF, ±10%, 25V, X7R, ±10%, SMD 0805; Manufacturer: PSA(Prosperity Dielectrics); Manufacturer Part Number: FN21X474K250ECG; Package Size: 0805; JLCPCB Basic Part: No; JLCPCB Part Number: C559448; Supplier 1: LCSC; Category: Capacitors - MLCC; Supplier Part Number 1: C559448; Tolerance: ±10%; Voltage Rating: 25V; Temperature Coefficient: X7R; RoHS: Yes; ComponentLink1Description: Datasheet; ComponentLink2Description: JLCPCB Part URL; ComponentLink2URL: https://jlcpcb.com/partdetail/C559448; ComponentLink3Description: LCSC Part URL; ComponentLink3URL: https://lcsc.com/product-detail/Multilayer-Ceramic-Capacitors-MLCC---SMD-SMT_PSAProsperity-Dielectrics-PSAProsperity-Dielectrics-FN21X474K250ECG_C559448.html
footprint CAP-0805 (0805 (2012M) Capacitor)
pins: 1, 2

## FN21X474K500EIG
designator C?  Capacitance: 470nF  (hidden comment: *)
Capacitor, Ceramic (MLCC), 470nF, ±10%, 50V, X7R, ±10%, SMD 0805; Manufacturer: PSA(Prosperity Dielectrics); Manufacturer Part Number: FN21X474K500EIG; Package Size: 0805; JLCPCB Basic Part: No; JLCPCB Part Number: C525310; Supplier 1: LCSC; Category: Capacitors - MLCC; Supplier Part Number 1: C525310; Tolerance: ±10%; Voltage Rating: 50V; Temperature Coefficient: X7R; RoHS: Yes; ComponentLink1Description: Datasheet; ComponentLink1URL: https://wmsc.lcsc.com/wmsc/upload/file/pdf/v2/lcsc/2304140030_PSA-Prosperity-Dielectrics-FN21X474K500EIG_C525310.pdf; ComponentLink2Description: JLCPCB Part URL; ComponentLink2URL: https://jlcpcb.com/partdetail/C525310; ComponentLink3Description: LCSC Part URL; ComponentLink3URL: https://lcsc.com/product-detail/Multilayer-Ceramic-Capacitors-MLCC---SMD-SMT_PSAProsperity-Dielectrics-PSAProsperity-Dielectrics-FN21X474K500EIG_C525310.html
footprint CAP-0805 (0805 (2012M) Capacitor)
pins: 1, 2

## FN21X561K500PXG
designator C?  Capacitance: 560pF  (hidden comment: *)
Capacitor, Ceramic (MLCC), 560pF, ±10%, 50V, X7R, ±10%, SMD 0805; Manufacturer: PSA(Prosperity Dielectrics); Manufacturer Part Number: FN21X561K500PXG; Package Size: 0805; JLCPCB Basic Part: No; JLCPCB Part Number: C565625; Supplier 1: LCSC; Category: Capacitors - MLCC; Supplier Part Number 1: C565625; Tolerance: ±10%; Voltage Rating: 50V; Temperature Coefficient: X7R; RoHS: Yes; ComponentLink1Description: Datasheet; ComponentLink1URL: https://wmsc.lcsc.com/wmsc/upload/file/pdf/v2/lcsc/2304140030_PSA-Prosperity-Dielectrics-FN21X561K500PXG_C565625.pdf; ComponentLink2Description: JLCPCB Part URL; ComponentLink2URL: https://jlcpcb.com/partdetail/C565625; ComponentLink3Description: LCSC Part URL; ComponentLink3URL: https://lcsc.com/product-detail/Multilayer-Ceramic-Capacitors-MLCC---SMD-SMT_PSAProsperity-Dielectrics-PSAProsperity-Dielectrics-FN21X561K500PXG_C565625.html
footprint CAP-0805 (0805 (2012M) Capacitor)
pins: 1, 2

## FN21X562K500PXG
designator C?  Capacitance: 5.6nF  (hidden comment: *)
Capacitor, Ceramic (MLCC), 5.6nF, ±10%, 50V, X7R, ±10%, SMD 0805; Manufacturer: PSA(Prosperity Dielectrics); Manufacturer Part Number: FN21X562K500PXG; Package Size: 0805; JLCPCB Basic Part: No; JLCPCB Part Number: C565626; Supplier 1: LCSC; Category: Capacitors - MLCC; Supplier Part Number 1: C565626; Tolerance: ±10%; Voltage Rating: 50V; Temperature Coefficient: X7R; RoHS: Yes; ComponentLink1Description: Datasheet; ComponentLink1URL: https://wmsc.lcsc.com/wmsc/upload/file/pdf/v2/lcsc/2304140030_PSA-Prosperity-Dielectrics-FN21X562K500PXG_C565626.pdf; ComponentLink2Description: JLCPCB Part URL; ComponentLink2URL: https://jlcpcb.com/partdetail/C565626; ComponentLink3Description: LCSC Part URL; ComponentLink3URL: https://lcsc.com/product-detail/Multilayer-Ceramic-Capacitors-MLCC---SMD-SMT_PSAProsperity-Dielectrics-PSAProsperity-Dielectrics-FN21X562K500PXG_C565626.html
footprint CAP-0805 (0805 (2012M) Capacitor)
pins: 1, 2

## FN21X563K500PXG
designator C?  Capacitance: 56nF  (hidden comment: *)
Capacitor, Ceramic (MLCC), 56nF, ±10%, 50V, X7R, ±10%, SMD 0805; Manufacturer: PSA(Prosperity Dielectrics); Manufacturer Part Number: FN21X563K500PXG; Package Size: 0805; JLCPCB Basic Part: No; JLCPCB Part Number: C525311; Supplier 1: LCSC; Category: Capacitors - MLCC; Supplier Part Number 1: C525311; Tolerance: ±10%; Voltage Rating: 50V; Temperature Coefficient: X7R; RoHS: Yes; ComponentLink1Description: Datasheet; ComponentLink1URL: https://wmsc.lcsc.com/wmsc/upload/file/pdf/v2/lcsc/2304140030_PSA-Prosperity-Dielectrics-FN21X563K500PXG_C525311.pdf; ComponentLink2Description: JLCPCB Part URL; ComponentLink2URL: https://jlcpcb.com/partdetail/C525311; ComponentLink3Description: LCSC Part URL; ComponentLink3URL: https://lcsc.com/product-detail/Multilayer-Ceramic-Capacitors-MLCC---SMD-SMT_PSAProsperity-Dielectrics-PSAProsperity-Dielectrics-FN21X563K500PXG_C525311.html
footprint CAP-0805 (0805 (2012M) Capacitor)
pins: 1, 2

## FN21X681K500PXG
designator C?  Capacitance: 680pF  (hidden comment: *)
Capacitor, Ceramic (MLCC), 680pF, ±10%, 50V, X7R, ±10%, SMD 0805; Manufacturer: PSA(Prosperity Dielectrics); Manufacturer Part Number: FN21X681K500PXG; Package Size: 0805; JLCPCB Basic Part: No; JLCPCB Part Number: C565607; Supplier 1: LCSC; Category: Capacitors - MLCC; Supplier Part Number 1: C565607; Tolerance: ±10%; Voltage Rating: 50V; Temperature Coefficient: X7R; RoHS: Yes; ComponentLink1Description: Datasheet; ComponentLink1URL: https://wmsc.lcsc.com/wmsc/upload/file/pdf/v2/lcsc/2304140030_PSA-Prosperity-Dielectrics-FN21X681K500PXG_C565607.pdf; ComponentLink2Description: JLCPCB Part URL; ComponentLink2URL: https://jlcpcb.com/partdetail/C565607; ComponentLink3Description: LCSC Part URL; ComponentLink3URL: https://lcsc.com/product-detail/Multilayer-Ceramic-Capacitors-MLCC---SMD-SMT_PSAProsperity-Dielectrics-PSAProsperity-Dielectrics-FN21X681K500PXG_C565607.html
footprint CAP-0805 (0805 (2012M) Capacitor)
pins: 1, 2

## FN21X683K500PXG
designator C?  Capacitance: 68nF  (hidden comment: *)
Capacitor, Ceramic (MLCC), 68nF, ±10%, 50V, X7R, ±10%, SMD 0805; Manufacturer: PSA(Prosperity Dielectrics); Manufacturer Part Number: FN21X683K500PXG; Package Size: 0805; JLCPCB Basic Part: No; JLCPCB Part Number: C525313; Supplier 1: LCSC; Category: Capacitors - MLCC; Supplier Part Number 1: C525313; Tolerance: ±10%; Voltage Rating: 50V; Temperature Coefficient: X7R; RoHS: Yes; ComponentLink1Description: Datasheet; ComponentLink1URL: https://wmsc.lcsc.com/wmsc/upload/file/pdf/v2/lcsc/2304140030_PSA-Prosperity-Dielectrics-FN21X683K500PXG_C525313.pdf; ComponentLink2Description: JLCPCB Part URL; ComponentLink2URL: https://jlcpcb.com/partdetail/C525313; ComponentLink3Description: LCSC Part URL; ComponentLink3URL: https://lcsc.com/product-detail/Multilayer-Ceramic-Capacitors-MLCC---SMD-SMT_PSAProsperity-Dielectrics-PSAProsperity-Dielectrics-FN21X683K500PXG_C525313.html
footprint CAP-0805 (0805 (2012M) Capacitor)
pins: 1, 2

## FN21X684K250ECG
designator C?  Capacitance: 680nF  (hidden comment: *)
Capacitor, Ceramic (MLCC), 680nF, ±10%, 25V, X7R, ±10%, SMD 0805; Manufacturer: PSA(Prosperity Dielectrics); Manufacturer Part Number: FN21X684K250ECG; Package Size: 0805; JLCPCB Basic Part: No; JLCPCB Part Number: C525315; Supplier 1: LCSC; Category: Capacitors - MLCC; Supplier Part Number 1: C525315; Tolerance: ±10%; Voltage Rating: 25V; Temperature Coefficient: X7R; RoHS: Yes; ComponentLink1Description: Datasheet; ComponentLink1URL: https://wmsc.lcsc.com/wmsc/upload/file/pdf/v2/lcsc/2304140030_PSA-Prosperity-Dielectrics-FN21X684K250ECG_C525315.pdf; ComponentLink2Description: JLCPCB Part URL; ComponentLink2URL: https://jlcpcb.com/partdetail/C525315; ComponentLink3Description: LCSC Part URL; ComponentLink3URL: https://lcsc.com/product-detail/Multilayer-Ceramic-Capacitors-MLCC---SMD-SMT_PSAProsperity-Dielectrics-PSAProsperity-Dielectrics-FN21X684K250ECG_C525315.html
footprint CAP-0805 (0805 (2012M) Capacitor)
pins: 1, 2